# Altium footprint library PcbLib1.PcbLib: 42 footprints (part 1 of 3)
Each footprint in its own frame and in the unit in brackets; x right, y up, seen from the top. Pads: shape width x height; smd on the part's side, far side on the other; paste and mask are expansions set on the pad; w line width, h text height; cw(c..) or ccw(c..) is an arc to the next point about the centre after c.
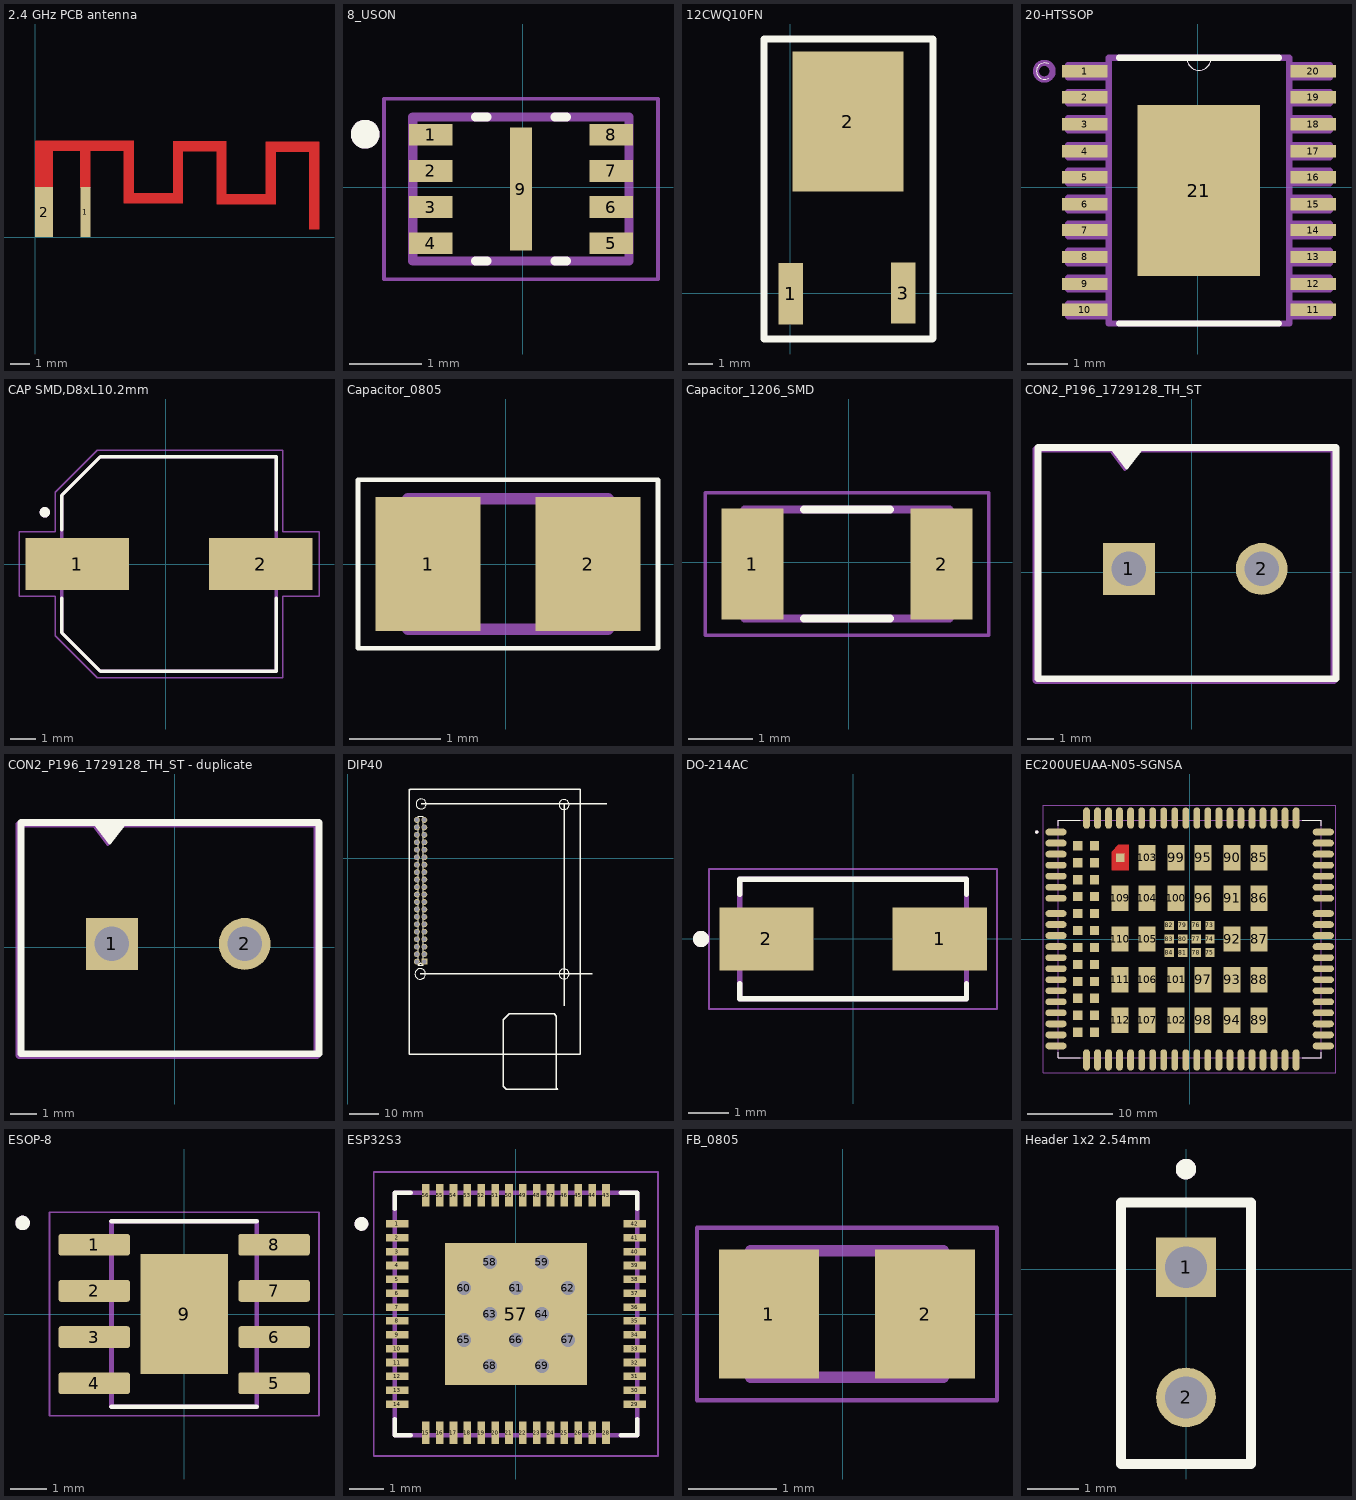
[diagram p0: the footprints below, top view; thin cyan lines are the x and y axes]

## 2.4 GHz PCB antenna [mm]
pads (2):
  rect 0.5x2.54 smd paste-2 mask+0: 1(2.55,1.275)
  rect 0.9x2.54 smd paste-2 mask+0: 2(0.45,1.275)
Top Layer:
  region: 0,1.8 0,4.9 0.9,4.9 0.9,1.8
  region: 0,4.9 5,4.9 5,4.4 0,4.4
  region: 2.3,2.525 2.3,4.9 2.8,4.9 2.8,2.525
  region: 4.5,1.725 4.5,4.9 5,4.9 5,1.725
  region: 7.5,1.725 4.5,1.725 4.5,2.225 7.5,2.225
  region: 7,1.725 7,4.869 7.5,4.869 7.5,1.725
  region: 9.7,4.369 7,4.369 7,4.869 9.7,4.869
  region: 9.2,1.687 9.2,4.862 9.7,4.862 9.7,1.687
  region: 12.2,1.675 9.2,1.675 9.2,2.175 12.2,2.175
  region: 11.7,1.675 11.7,4.85 12.2,4.85 12.2,1.675
  region: 14.4,4.35 11.7,4.35 11.7,4.85 14.4,4.85
  region: 13.9,0.4 13.9,4.825 14.4,4.825 14.4,0.4

## 8_USON [mm]
pads (9):
  rect 0.6x0.3 smd paste-1 mask+0.025: 1(-1.275,0.725) 2(-1.275,0.225) 3(-1.275,-0.275) 4(-1.275,-0.775) 5(1.225,-0.775) 6(1.225,-0.275) 7(1.225,0.225) 8(1.225,0.725)
  rect 0.3x1.7 smd paste-2 mask+0.025: 9(-0.025,-0.025)
Top Overlay:
  circle w0.2: c-2.185,0.735 r0.1
  lines w0.127: -0.655,-1.025 -0.495,-1.025 ; -0.655,0.975 -0.495,0.975 ; 0.445,-1.025 0.605,-1.025 ; 0.445,0.975 0.605,0.975
Top Paste:
  region: 0.075,0.075 -0.125,0.075 -0.125,0.575 0.075,0.575
  region: 0.075,-0.625 -0.125,-0.625 -0.125,-0.125 0.075,-0.125
Mechanical 13:
  circle w0.2: c-2.185,0.735 r0.1
  lines w0.127: -1.525,-1.025 -1.525,0.975 1.475,0.975 1.475,-1.025 -1.525,-1.025
Mechanical 15:
  lines w0.05: -1.925,-1.275 -1.925,1.225 1.875,1.225 1.875,-1.275 -1.925,-1.275
3D body "step_temp.STEP": height 0.6, standoff 0, extent -1.525,-1.025 1.475,0.975

## 12CWQ10FN [mm]
pads (3):
  rect 1x2.5 smd: 1(0.025,-0.025) 3(4.6,0)
  rect 4.54x5.71 smd: 2(2.35,7)
Top Overlay:
  lines w0.3: -1.075,-1.875 5.8,-1.875 5.825,-1.85 5.825,-1.55 5.825,-0.45 5.825,10.375 -1.075,10.375 -1.075,9.3 -1.075,-0.6 -1.075,-1.875
3D body "12CWQ10FN.STEP": height 2.4, standoff -0.11, extent -0.92,-0.553 5.62,9.353

## 20-HTSSOP [mil]
pads (21):
  rect 44x12 smd: 1(-109.02,112.05) 2(-109.02,87.05) 3(-109.02,61.05) 4(-109.02,35.05) 5(-109.02,10.05) 6(-109.02,-15.95) 7(-109.02,-40.95) 8(-109.02,-66.95) 9(-109.02,-92.95) 10(-109.02,-117.95) 11(110.98,-117.95) 12(110.98,-92.95) 13(110.98,-66.95) 14(110.98,-40.95) 15(110.98,-15.95) 16(110.98,10.05) 17(110.98,35.05) 18(110.98,61.05) 19(110.98,87.05) 20(110.98,112.05)
  rect 118x165 smd: 21(0.98,-2.95)
Top Overlay:
  lines w0: -143.95,105.08 cw(c-147.66,112.05) -143.95,119.02 ; -11.02,125.05 ccw(c0.98,125.05) 12.98,125.05
  lines w6: -76.02,-130.95 77.98,-130.95 ; -76.02,125.05 -11.02,125.05 12.98,125.05 77.98,125.05
Mechanical 13:
  lines w0: -11.02,125.05 ccw(c0.98,125.05) 12.98,125.05
  lines w6: -156.02,112.05 cw(c-148.02,112.05) -140.02,112.05 cw(c-148.02,112.05) -156.02,112.05 ; -125.02,-123.95 -86.02,-123.95 -86.02,-111.95 -125.02,-111.95 -125.02,-123.95 ; -125.02,-97.95 -86.02,-97.95 -86.02,-86.95 -125.02,-86.95 -125.02,-97.95 ; -125.02,-72.95 -86.02,-72.95 -86.02,-60.95 -125.02,-60.95 -125.02,-72.95 ; -125.02,-46.95 -86.02,-46.95 -86.02,-34.95 -125.02,-34.95 -125.02,-46.95 ; -125.02,-21.95 -86.02,-21.95 -86.02,-9.95 -125.02,-9.95 -125.02,-21.95 ; -125.02,4.05 -86.02,4.05 -86.02,16.05 -125.02,16.05 -125.02,4.05 ; -125.02,29.05 -86.02,29.05 -86.02,41.05 -125.02,41.05 -125.02,29.05 ; -125.02,55.05 -86.02,55.05 -86.02,67.05 -125.02,67.05 -125.02,55.05 ; -125.02,81.05 -86.02,81.05 -86.02,92.05 -125.02,92.05 -125.02,81.05 ; -125.02,106.05 -86.02,106.05 -86.02,118.05 -125.02,118.05 -125.02,106.05 ; -86.02,-130.95 -86.02,125.05 -11.02,125.05 12.98,125.05 87.98,125.05 87.98,-130.95 -86.02,-130.95 ; 87.98,-123.95 126.98,-123.95 126.98,-111.95 87.98,-111.95 87.98,-123.95 ; 87.98,-97.95 126.98,-97.95 126.98,-86.95 87.98,-86.95 87.98,-97.95 ; 87.98,-72.95 126.98,-72.95 126.98,-60.95 87.98,-60.95 87.98,-72.95 ; 87.98,-46.95 126.98,-46.95 126.98,-34.95 87.98,-34.95 87.98,-46.95 ; 87.98,-21.95 126.98,-21.95 126.98,-9.95 87.98,-9.95 87.98,-21.95 ; 87.98,4.05 126.98,4.05 126.98,16.05 87.98,16.05 87.98,4.05 ; 87.98,29.05 126.98,29.05 126.98,41.05 87.98,41.05 87.98,29.05 ; 87.98,55.05 126.98,55.05 126.98,67.05 87.98,67.05 87.98,55.05 ; 87.98,81.05 126.98,81.05 126.98,92.05 87.98,92.05 87.98,81.05 ; 87.98,106.05 126.98,106.05 126.98,118.05 87.98,118.05 87.98,106.05
3D body "step_temp.STEP": height 43.31, standoff 0, extent -125,-130.91 126.97,125

## CAP SMD,D8xL10.2mm [mm]
pads (2):
  rect 4x2 smd: 1(-3.423,0) 2(3.677,0)
Top Overlay:
  circle w0.2: c-4.673,2 r0.1
  lines w0.127: -4.023,-1.32 -4.023,-2.65 -2.523,-4.15 4.277,-4.15 4.277,-1.32 ; -4.023,1.32 -4.023,2.65 -2.523,4.15 4.277,4.15 4.277,1.32
Mechanical 13:
  circle w0.2: c-4.673,2 r0.1
  lines w0.127: -4.023,-2.65 -2.523,-4.15 4.277,-4.15 4.277,4.15 -2.523,4.15 -4.023,2.65 -4.023,-2.65
Mechanical 15:
  lines w0.05: -5.673,-1.25 -5.673,1.25 -4.273,1.25 -4.273,2.775 -2.648,4.4 4.527,4.4 4.527,1.25 5.927,1.25 5.927,-1.25 4.527,-1.25 4.527,-4.4 -2.648,-4.4 -4.273,-2.775 -4.273,-1.25 -5.673,-1.25
3D body "step_temp.STEP": height 10.2, standoff 0, extent -4.723,-4.15 4.977,4.15

## Capacitor_0805 [mm]
pads (2):
  rect 1.16x1.47 smd: 1(-0.855,0) 2(0.905,0)
Top Overlay:
  lines w0.05: -1.625,-0.925 -1.625,0.925 1.675,0.925 1.675,-0.925 -1.625,-0.925
Mechanical 1:
  lines w0.127: -1.075,-0.72 1.125,-0.72 1.125,0.72 -1.075,0.72 -1.075,-0.72
  text ".Designator" at -0.075,-0.067 h1.8
3D body "0805YC103J4T2A.STEP": height 0.95, standoff 0.01, extent -1.005,-0.625 1.005,0.625

## Capacitor_1206_SMD [mm]
pads (2):
  rect 0.97x1.73 smd: 1(-1.505,-0.025) 2(1.455,-0.025)
Top Overlay:
  lines w0.127: -0.695,-0.875 0.645,-0.875 ; -0.695,0.825 0.645,0.825
Mechanical 1:
  lines w0.127: -1.625,-0.875 -1.625,0.825 1.575,0.825 1.575,-0.875 -1.625,-0.875
  text ".Designator" at -0.125,-0.15 h1.8
Mechanical 15:
  lines w0.05: -2.24,-1.14 -2.24,1.09 2.19,1.09 2.19,-1.14 -2.24,-1.14
3D body "C3216X5R1C106K160AA..STEP": height 1.61, standoff 0.01, extent -1.6,-0.775 1.6,0.825

## CON2_P196_1729128_TH_ST [mm]
pads (2):
  rect 1.95x1.95 / inner round 1.95 / far side rect 1.95x1.95 hole 1.3: 1(-2.361,0.119)
  round 1.95 hole 1.3: 2(2.639,0.119)
Top Overlay:
  region: -2.945,4.64 -1.98,4.64 -1.98,4.437 -2.437,3.98
  lines w0.127: -2.996,4.666 -2.443,3.929 -1.861,4.677
  lines w0.254: -5.79,-4.021 -2.183,-4.021 5.439,-4.021 5.439,4.691 -5.79,4.691 -5.79,0.346 -5.79,-4.021
Mechanical 1:
  region: -3.019,4.578 -2.053,4.578 -2.053,4.374 -2.511,3.917
  lines w0.127: -3.069,4.603 -2.517,3.866 -1.934,4.615
  lines w0.254: -5.863,-4.084 -2.257,-4.084 5.366,-4.084 5.366,4.628 -5.863,4.628 -5.863,0.283 -5.863,-4.084
  text ".Designator" at -0.2,-0.075 h1.8
3D body "1729018.stp": height 10.51, standoff -2.99, extent -5.487,-3.713 5.083,4.437

## CON2_P196_1729128_TH_ST - duplicate [mm]
pads (2):
  rect 1.95x1.95 / inner round 1.95 / far side rect 1.95x1.95 hole 1.3: 1(-2.361,0.119)
  round 1.95 hole 1.3: 2(2.639,0.119)
Top Overlay:
  region: -2.945,4.64 -1.98,4.64 -1.98,4.437 -2.437,3.98
  lines w0.127: -2.996,4.666 -2.443,3.929 -1.861,4.677
  lines w0.254: -5.79,-4.021 -5.79,0.346 -5.79,4.691 5.439,4.691 5.439,-4.021 -2.183,-4.021 -5.79,-4.021
Mechanical 1:
  region: -3.019,4.578 -2.053,4.578 -2.053,4.374 -2.511,3.917
  lines w0.127: -3.069,4.603 -2.517,3.866 -1.934,4.615
  lines w0.254: -5.863,-4.084 -5.863,0.283 -5.863,4.628 5.366,4.628 5.366,-4.084 -2.257,-4.084 -5.863,-4.084
  text ".Designator" at -0.2,-0.075 h1.8
3D body "1729018.stp": height 10.51, standoff -2.99, extent -5.487,-3.713 5.083,4.437

## DIP40 [mm]
pads (40):
  rect 2x2 hole 1.5: 1(26.1,-35.2)
  round 2 hole 1.5: 2(26.1,-32.66) 3(26.1,-30.12) 4(26.1,-27.58) 5(26.1,-25.04) 6(26.1,-22.5) 7(26.1,-19.96) 8(26.1,-17.42) 9(26.1,-14.88) 10(26.1,-12.34) 11(26.1,-9.8) 12(26.1,-7.26) 13(26.1,-4.72) 14(26.1,-2.18) 15(26.1,0.36) 16(26.1,2.9) 17(26.1,5.44) 18(26.1,7.98) 19(26.1,10.52) 20(26.1,13.06) 21(23.56,13.06) 22(23.56,10.52) 23(23.56,7.98) 24(23.56,5.44) 25(23.56,2.9) 26(23.56,0.36) 27(23.56,-2.18) 28(23.56,-4.72) 29(23.56,-7.26) 30(23.56,-9.8) 31(23.56,-12.34) 32(23.56,-14.88) 33(23.56,-17.42) 34(23.56,-19.96) 35(23.56,-22.5) 36(23.56,-25.04) 37(23.56,-27.58) 38(23.56,-30.12) 39(23.56,-32.66) 40(23.56,-35.2)
Top Overlay:
  circle w0.254: c73.7,-39.4 r1.7
  circle w0.254: c73.7,18.3 r1.7
  circle w0.254: c24.7,-39.4 r1.8
  circle w0.254: c25,18.5 r1.7
  lines w0.254: 23.941,-36.47 23.941,14.33 25.719,14.33 25.719,-36.47 24.195,-36.47 cw(c24.83,-36.47) 25.465,-36.47 23.941,-36.47
  lines w0.5: 20.9,23.2 21.3,23.6 79.2,23.6 79.2,-66.7 79.1,-66.8 21.1,-66.8 20.9,-66.6 20.9,23.6 21.1,23.4 ; 24.7,-39.4 83.3,-39.4 ; 25,18.5 88.3,18.5 ; 71.1,-78.6 71.1,-66.7 71.1,-53.8 70.3,-53 55,-53 53,-55 53,-77.6 54,-78.6 71.5,-78.6 71.3,-78.4 ; 73.7,-50.3 73.7,18.3
3D body "RaspberryPi5.step": height 5.85, standoff -13.94, extent 21.3,-66.8 78.963,23.2

## DO-214AC [mm]
pads (2):
  rect 2.33x1.56 smd: 1(2.14,0) 2(-2.14,0)
Top Overlay:
  circle w0.2: c-3.755,0 r0.1
  lines w0.127: -2.8,-1.1 -2.8,-1.475 2.8,-1.475 2.8,-1.1 ; -2.8,1.1 -2.8,1.475 2.8,1.475 2.8,1.1
Mechanical 13:
  circle w0.2: c-3.755,0 r0.1
  lines w0.127: -2.8,-1.475 2.8,-1.475 2.8,1.475 -2.8,1.475 -2.8,-1.475
Mechanical 15:
  lines w0.05: -3.555,-1.725 -3.555,1.725 3.555,1.725 3.555,-1.725 -3.555,-1.725
3D body "step_temp.STEP": height 1.43, standoff 0, extent -1.8,-0.9 1.8,0.9

## EC200UEUAA-N05-SGNSA [mm]
pads (144):
  oval 2.5x0.8 smd: 1(-15.75,12.6) 2(-15.75,11.3) 3(-15.75,10) 4(-15.75,8.7) 5(-15.75,7.4) 6(-15.75,6.1) 7(-15.75,4.8) 8(-15.75,0.4) 9(-15.75,-0.9) 10(-15.75,-2.2) 11(-15.75,-3.5) 12(-15.75,-4.8) 13(-15.75,-6.1) 14(-15.75,-7.4) 15(-15.75,-8.7) 16(-15.75,-10) 17(-15.75,-11.3) 18(-15.75,-12.6) 37(15.75,-12.6) 38(15.75,-11.3) 39(15.75,-10) 40(15.75,-8.7) 41(15.75,-7.4) 42(15.75,-6.1) 43(15.75,-4.8) 44(15.75,-3.5) 45(15.75,-2.2) 46(15.75,-0.9) 47(15.75,0.4) 48(15.75,4.8) 49(15.75,6.1) 50(15.75,7.4) 51(15.75,8.7) 52(15.75,10) 53(15.75,11.3) 54(15.75,12.6) 141(-15.75,3) 142(-15.75,1.7) 143(15.75,1.7) 144(15.75,3)
  oval 0.8x2.5 smd: 19(-9.55,-14.25) 20(-8.25,-14.25) 21(-6.95,-14.25) 22(-5.65,-14.25) 23(-4.35,-14.25) 24(-3.05,-14.25) 25(-1.75,-14.25) 26(-0.45,-14.25) 27(0.85,-14.25) 28(2.15,-14.25) 29(3.45,-14.25) 30(4.75,-14.25) 31(6.05,-14.25) 32(7.35,-14.25) 33(8.65,-14.25) 34(9.95,-14.25) 35(11.25,-14.25) 36(12.55,-14.25) 55(12.55,14.25) 56(11.25,14.25) 57(9.95,14.25) 58(8.65,14.25) 59(7.35,14.25) 60(6.05,14.25) 61(4.75,14.25) 62(3.45,14.25) 63(2.15,14.25) 64(0.85,14.25) 65(-0.45,14.25) 66(-1.75,14.25) 67(-3.05,14.25) 68(-4.35,14.25) 69(-5.65,14.25) 70(-6.95,14.25) 71(-8.25,14.25) 72(-9.55,14.25) 113(-10.85,14.25) 114(-12.15,14.25) 115(-10.85,-14.25) 116(-12.15,-14.25)
  rect 1.1x1.1 smd: 73(2.4,1.6) 74(2.4,0) 75(2.4,-1.6) 76(0.8,1.6) 77(0.8,0) 78(0.8,-1.6) 79(-0.8,1.6) 80(-0.8,0) 81(-0.8,-1.6) 82(-2.4,1.6) 83(-2.4,0) 84(-2.4,-1.6) 117(-11.2,11) 118(-11.2,9) 119(-11.2,7) 120(-11.2,5) 121(-11.2,3) 122(-11.2,1) 123(-11.2,-1) 124(-11.2,-3) 125(-11.2,-5) 126(-11.2,-7) 127(-11.2,-9) 128(-11.2,-11) 129(-13.2,11) 130(-13.2,9) 131(-13.2,7) 132(-13.2,5) 133(-13.2,3) 134(-13.2,1) 135(-13.2,-1) 136(-13.2,-3) 137(-13.2,-5) 138(-13.2,-7) 139(-13.2,-9) 140(-13.2,-11)
  rect 2x3 smd: 85(8.2,9.6) 86(8.2,4.8) 87(8.2,0) 88(8.2,-4.8) 89(8.2,-9.6) 90(5,9.6) 91(5,4.8) 92(5,0) 93(5,-4.8) 94(5,-9.6) 95(1.6,9.6) 96(1.6,4.8) 97(1.6,-4.8) 98(1.6,-9.6) 99(-1.6,9.6) 100(-1.6,4.8) 101(-1.6,-4.8) 102(-1.6,-9.6) 103(-5,9.6) 104(-5,4.8) 105(-5,0) 106(-5,-4.8) 107(-5,-9.6) 109(-8.2,4.8) 110(-8.2,0) 111(-8.2,-4.8) 112(-8.2,-9.6)
  rect 1x1 smd paste-1 mask+0: 108(-8.2,9.6)
Top Layer:
  region: -7.2,8.1 -9.2,8.1 -9.2,10.3 -8.4,11.1 -7.2,11.1
Top Overlay:
  circle w0.2: c-18,12.6 r0.1
  lines w0.127: -15.5,-13.32 -15.5,-14 -12.87,-14 ; -15.5,13.32 -15.5,14 -12.87,14 ; 13.27,-14 15.5,-14 15.5,-13.32 ; 13.27,14 15.5,14 15.5,13.32
Top Paste:
  region: -7.2,8.1 -9.2,8.1 -9.2,10.3 -8.4,11.1 -7.2,11.1
Top Solder:
  region: -7.1,8 -9.3,8 -9.3,10.35 -8.45,11.2 -7.1,11.2
Mechanical 13:
  circle w0.2: c-18,12.6 r0.1
  lines w0.127: -15.5,-14 -15.5,14 15.5,14 15.5,-14 -15.5,-14
Mechanical 15:
  lines w0.05: -17.25,-15.75 17.25,-15.75 17.25,15.75 -17.25,15.75 -17.25,-15.75
3D body "step_temp.STEP": height 2.35, standoff 0, extent -15.5,-14 15.5,14

## ESOP-8 [mm]
pads (9):
  rrect25% 1.97x0.6 smd: 1(-2.475,1.905) 2(-2.475,0.635) 3(-2.475,-0.635) 4(-2.475,-1.905) 5(2.475,-1.905) 6(2.475,-0.635) 7(2.475,0.635) 8(2.475,1.905)
  rect 2.413x3.302 smd paste-3: 9(0,0)
Top Overlay:
  circle w0.2: c-4.445,2.505 r0.1
  lines w0.127: -2,-2.55 2,-2.55 ; -2,2.55 2,2.55
Top Paste:
  region: 0.645,-0.82 -0.645,-0.82 -0.645,0.82 0.645,0.82
Mechanical 13:
  circle w0.2: c-4.445,2.505 r0.1
  lines w0.127: -2,-2.55 2,-2.55 2,2.55 -2,2.55 -2,-2.55
Mechanical 15:
  lines w0.05: -3.71,-2.8 3.71,-2.8 3.71,2.8 -3.71,2.8 -3.71,-2.8
3D body "step_temp.STEP": height 1.75, standoff 0, extent -3,-2.45 3,2.45

## ESP32S3 [mm]
pads (69):
  rect 0.65x0.22 smd mask+0.045: 1(-3.425,2.6) 2(-3.425,2.2) 3(-3.425,1.8) 4(-3.425,1.4) 5(-3.425,1) 6(-3.425,0.6) 7(-3.425,0.2) 8(-3.425,-0.2) 9(-3.425,-0.6) 10(-3.425,-1) 11(-3.425,-1.4) 12(-3.425,-1.8) 13(-3.425,-2.2) 14(-3.425,-2.6) 29(3.425,-2.6) 30(3.425,-2.2) 31(3.425,-1.8) 32(3.425,-1.4) 33(3.425,-1) 34(3.425,-0.6) 35(3.425,-0.2) 36(3.425,0.2) 37(3.425,0.6) 38(3.425,1) 39(3.425,1.4) 40(3.425,1.8) 41(3.425,2.2) 42(3.425,2.6)
  rect 0.22x0.65 smd mask+0.045: 15(-2.6,-3.425) 16(-2.2,-3.425) 17(-1.8,-3.425) 18(-1.4,-3.425) 19(-1,-3.425) 20(-0.6,-3.425) 21(-0.2,-3.425) 22(0.2,-3.425) 23(0.6,-3.425) 24(1,-3.425) 25(1.4,-3.425) 26(1.8,-3.425) 27(2.2,-3.425) 28(2.6,-3.425) 43(2.6,3.425) 44(2.2,3.425) 45(1.8,3.425) 46(1.4,3.425) 47(1,3.425) 48(0.6,3.425) 49(0.2,3.425) 50(-0.2,3.425) 51(-0.6,3.425) 52(-1,3.425) 53(-1.4,3.425) 54(-1.8,3.425) 55(-2.2,3.425) 56(-2.6,3.425)
  rect 4.1x4.1 smd paste-1.55: 57(0,0)
  round 0.5 hole 0.4 mask+0: 58(-0.75,1.5) 59(0.75,1.5) 60(-1.5,0.75) 61(0,0.75) 62(1.5,0.75) 63(-0.75,0) 64(0.75,0) 65(-1.5,-0.75) 66(0,-0.75) 67(1.5,-0.75) 68(-0.75,-1.5) 69(0.75,-1.5)
Top Overlay:
  circle w0.2: c-4.455,2.6 r0.1
  lines w0.127: -3.5,-3.03 -3.5,-3.5 -3.03,-3.5 ; -3.5,3.03 -3.5,3.5 -3.03,3.5 ; 3.03,-3.5 3.5,-3.5 3.5,-3.03 ; 3.03,3.5 3.5,3.5 3.5,3.03
Top Paste:
  region: -1,1 -2,1 -2,2 -1,2
  region: -1,-0.5 -2,-0.5 -2,0.5 -1,0.5
  region: -1,-2 -2,-2 -2,-1 -1,-1
  region: 0.5,-2 -0.5,-2 -0.5,-1 0.5,-1
  region: 2,-2 1,-2 1,-1 2,-1
  region: 2,-0.5 1,-0.5 1,0.5 2,0.5
  region: 2,1 1,1 1,2 2,2
  region: 0.5,1 -0.5,1 -0.5,2 0.5,2
Mechanical 13:
  circle w0.2: c-4.455,2.6 r0.1
  lines w0.127: -3.5,-3.5 -3.5,3.5 3.5,3.5 3.5,-3.5 -3.5,-3.5
Mechanical 15:
  lines w0.05: -4.1,-4.1 -4.1,4.1 4.1,4.1 4.1,-4.1 -4.1,-4.1
3D body "step_temp.STEP": height 0.9, standoff 0, extent -3.5,-3.5 3.5,3.5

## FB_0805 [mm]
pads (2):
  rect 1.14x1.47 smd: 1(-0.84,0) 2(0.94,0)
Mechanical 1:
  lines w0.127: -1.05,-0.72 -1.05,0.72 1.15,0.72 1.15,-0.72 -1.05,-0.72
  text ".Designator" at -0.125,-0.15 h1.8
Mechanical 15:
  lines w0.05: -1.658,-0.983 1.758,-0.983 1.758,0.983 -1.658,0.983 -1.658,-0.983
3D body "step_temp.STEP": height 1.05, standoff 0, extent -0.95,-0.625 1.05,0.625

## Header 1x2 2.54mm [mm]
pads (2):
  rect 1.163x1.163 / inner round 1.163 / far side rect 1.163x1.163 hole 0.813: 1(0,0.04)
  round 1.163 hole 0.813: 2(0,-2.5)
Top Overlay:
  circle w0.2: c0,1.96 r0.1
  lines w0.2: -1.27,-3.8 1.27,-3.8 1.27,1.31 -1.27,1.31 -1.27,-3.8
Mechanical 1:
  circle w0.2: c0,1.96 r0.1
  lines w0.1: -1.27,1.31 1.27,1.31 ; -1.27,1.31 -1.27,-3.8 1.27,-3.8 1.27,1.31 ; -1.27,1.31 1.27,1.31
3D body "826629-2--3DModel-STEP-1.STEP": height 9.51, standoff -3.19, extent -1.35,-3.84 1.15,1.24